# Altium footprint library Mechanical.PcbLib: 125 footprints (part 5 of 8)
Each footprint in its own frame and in the unit in brackets; x right, y up, seen from the top. Pads: shape width x height; smd on the part's side, far side on the other; paste and mask are expansions set on the pad; w line width, h text height; cw(c..) or ccw(c..) is an arc to the next point about the centre after c.
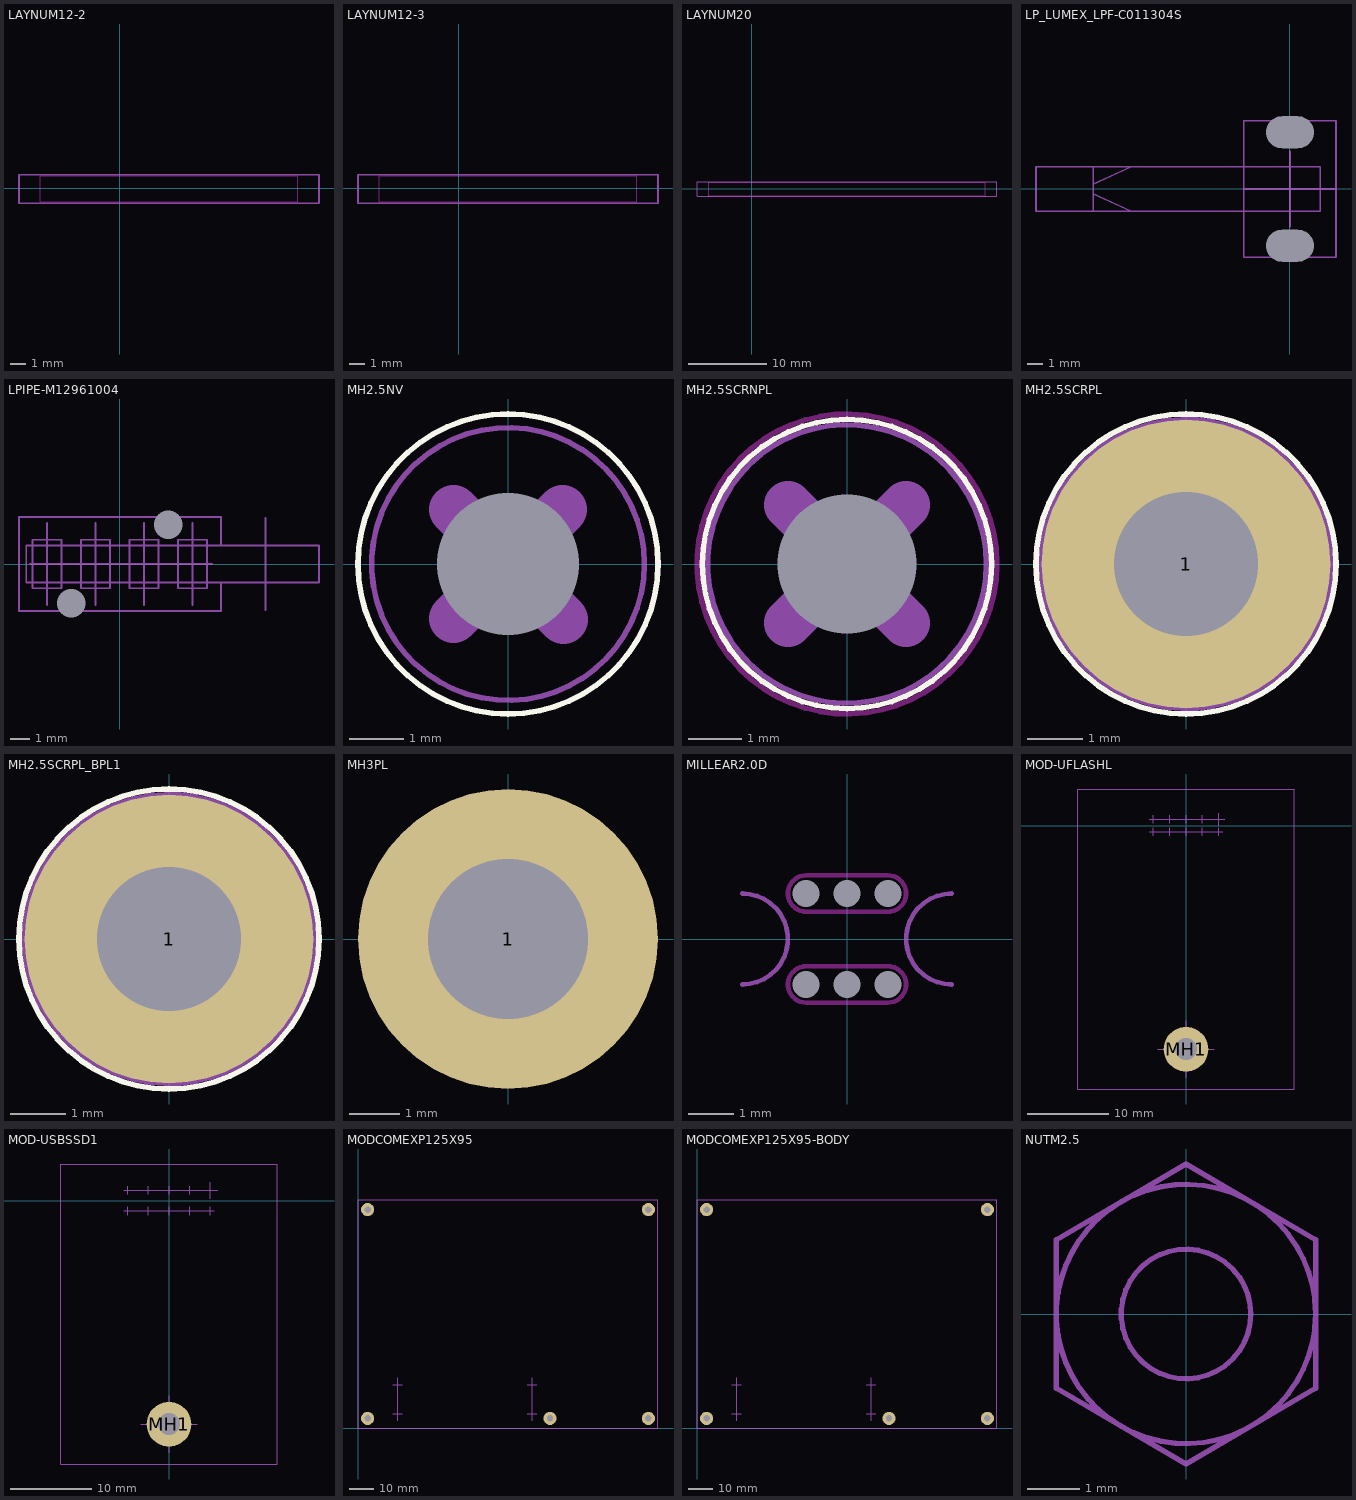
[diagram p4: the footprints below, top view; thin cyan lines are the x and y axes]

## LAYNUM12-2 [mm] "PCB 1.6mm 12 layer SGSGSPPSGSGS"
Top Layer:
  text "1" at -4.826,-0.584 h1.78
MidLayer1:
  text "3" at -2.21,-0.584 h1.78
MidLayer2:
  text "5" at 0.33,-0.584 h1.78
MidLayer3:
  text "8" at 4.166,-0.584 h1.78
MidLayer4:
  text "10" at 6.5,-0.6 h1.78
Bottom Layer:
  text "12" at 10,-0.6 h1.78
Top Solder:
  text "T" at -6.477,-0.584 h1.78
Bottom Solder:
  text "B" at 13.001,-0.584 h1.78
InternalPlane1:
  rectangle: -2.4,-0.889 11.8,0.8
  rectangle: -5.2,-0.889 -3.752,0.8
  text "2" at -3.556,-0.584 h1.78
InternalPlane2:
  region: -1.2,0.8 -5.2,0.8 -5.2,-0.9 -1.2,-0.9
  region: 11.8,0.8 0,0.8 0,-0.9 11.8,-0.9
  text "4" at -0.965,-0.584 h1.78
InternalPlane3:
  region: 11.8,0.8 2.7,0.8 2.7,-0.9 11.8,-0.9
  region: 1.4,0.8 -5.2,0.8 -5.2,-0.9 1.4,-0.9
  text "6" at 1.676,-0.584 h1.78
InternalPlane4:
  region: 11.8,0.8 3.9,0.8 3.9,-0.9 11.8,-0.9
  region: 2.6,0.8 -5.2,0.8 -5.2,-0.9 2.6,-0.9
  text "7" at 2.896,-0.584 h1.78
InternalPlane5:
  region: 5.2,0.8 -5.2,0.8 -5.2,-0.9 5.2,-0.9
  region: 11.8,0.8 6.5,0.8 6.5,-0.9 11.8,-0.9
  text "9" at 5.466,-0.584 h1.78
InternalPlane6:
  region: 11.8,0.8 9.8,0.8 9.8,-0.9 11.8,-0.9
  region: 8.2,0.8 -5.2,0.8 -5.2,-0.9 8.2,-0.9
  text "11" at 8.3,-0.6 h1.78
Keep-Out Layer:
  lines w0.025: -5.258,-0.9 11.843,-0.9 11.843,0.813 -5.258,0.813 -5.258,-0.9
Mechanical 15:
  lines w0.102: -6.68,-1 13.255,-1 13.255,0.889 -6.68,0.889 -6.68,-1

## LAYNUM12-3 [mm] "PCB 1.6mm 12 layer SGSGSssSGSGS"
Top Layer:
  text "1" at -4.826,-0.584 h1.78
MidLayer1:
  text "3" at -2.21,-0.584 h1.78
MidLayer2:
  text "5" at 0.33,-0.584 h1.78
MidLayer3:
  text "6" at 1.625,-0.6 h1.78
MidLayer4:
  text "7" at 2.875,-0.6 h1.78
MidLayer5:
  text "8" at 4.166,-0.584 h1.78
MidLayer6:
  text "10" at 6.5,-0.6 h1.78
Bottom Layer:
  text "12" at 10,-0.6 h1.78
Top Solder:
  text "T" at -6.477,-0.584 h1.78
Bottom Solder:
  text "B" at 13.001,-0.584 h1.78
InternalPlane1:
  rectangle: -5.2,-0.889 -3.752,0.8
  rectangle: -2.4,-0.889 11.8,0.8
  text "2" at -3.556,-0.584 h1.78
InternalPlane2:
  region: 11.8,0.8 0,0.8 0,-0.9 11.8,-0.9
  region: -1.2,0.8 -5.2,0.8 -5.2,-0.9 -1.2,-0.9
  text "4" at -0.965,-0.584 h1.78
InternalPlane3:
  region: 5.125,0.8 -5.2,0.8 -5.2,-0.9 5.125,-0.9
  region: 11.8,0.8 6.35,0.8 6.35,-0.9 11.8,-0.9
  text "9" at 5.35,-0.6 h1.78
InternalPlane4:
  region: 8.2,0.8 -5.2,0.8 -5.2,-0.9 8.2,-0.9
  region: 11.8,0.8 9.975,0.8 9.975,-0.9 11.8,-0.9
  text "11" at 8.375,-0.625 h1.78
Keep-Out Layer:
  lines w0.025: -5.258,-0.9 -5.258,0.813 11.843,0.813 11.843,-0.9 -5.258,-0.9
Mechanical 15:
  lines w0.102: -6.68,-1 -6.68,0.889 13.255,0.889 13.255,-1 -6.68,-1

## LAYNUM20 [mm] "PCB 3.2mm 20 layer"
Top Layer:
  text "1" at -5.2,-0.6 h1.78
MidLayer1:
  text "3" at -2.2,-0.6 h1.78
MidLayer2:
  text "5" at 0.8,-0.6 h1.78
MidLayer3:
  text "7" at 3.8,-0.6 h1.78
MidLayer4:
  text "9" at 6.8,-0.6 h1.78
MidLayer5:
  text "11" at 10.2,-0.6 h1.78
MidLayer6:
  text "13" at 14,-0.6 h1.78
MidLayer7:
  text "15" at 18,-0.6 h1.78
MidLayer8:
  text "17" at 22,-0.6 h1.78
MidLayer9:
  text "19" at 26,-0.6 h1.78
Bottom Layer:
  text "20" at 28,-0.6 h1.78
Top Solder:
  text "T" at -6.7,-0.6 h1.78
Bottom Solder:
  text "B" at 31,-0.6 h1.78
InternalPlane1:
  rectangle: -2.642,-0.914 29.87,0.813
  rectangle: -5.512,-0.914 -3.962,0.813
  text "2" at -3.7,-0.6 h1.78
InternalPlane2:
  rectangle: 0.279,-0.94 29.87,0.813
  rectangle: -5.512,-0.914 -0.889,0.813
  text "4" at -0.7,-0.6 h1.78
InternalPlane3:
  rectangle: 3.226,-0.914 29.896,0.838
  rectangle: -5.537,-0.914 2.134,0.838
  text "6" at 2.3,-0.6 h1.78
InternalPlane4:
  rectangle: 6.198,-0.914 29.87,0.813
  rectangle: -5.512,-0.914 5.156,0.813
  text "8" at 5.3,-0.6 h1.78
InternalPlane5:
  rectangle: -5.512,-0.914 8.128,0.813
  rectangle: 10.084,-0.914 29.87,0.813
  text "10" at 8.3,-0.6 h1.78
InternalPlane6:
  rectangle: -5.512,-0.914 11.913,0.813
  rectangle: 13.894,-0.914 29.87,0.813
  text "12" at 12.1,-0.6 h1.78
InternalPlane7:
  rectangle: -5.512,-0.914 15.824,0.813
  rectangle: 17.805,-0.94 29.87,0.813
  text "14" at 16,-0.6 h1.78
InternalPlane8:
  rectangle: -2.642,-0.914 19.812,0.813
  rectangle: 21.768,-0.914 29.87,0.813
  text "16" at 20,-0.6 h1.78
InternalPlane9:
  rectangle: -5.512,-0.914 23.825,0.813
  rectangle: 25.781,-0.914 29.87,0.813
  text "18" at 24,-0.6 h1.78
Keep-Out Layer:
  lines w0.025: -5.512,-0.914 -5.512,0.813 29.87,0.813 29.87,-0.914 -5.512,-0.914
Mechanical 15:
  lines w0.102: -7,-1 31.394,-1 31.394,0.889 -7,0.889 -7,-1

## LP_LUMEX_LPF-C011304S [mm]
height 7
pads (2):
  oval 1x0 hole 2 slot 3 at 0 deg unplated mask+1.2: MH1(0,-3.575) MH1(0,3.575)
Mechanical 13:
  lines w0.1: -12.4,-1.4 -12.4,1.4 ; -12.4,-0.3 -10,-1.4 ; -12.4,0.3 -10,1.4 ; -16,-1.4 1.9,-1.4 1.9,1.4 -16,1.4 -16,-1.4 ; -2.9,-4.3 -2.9,4.3 2.9,4.3 2.9,-4.3 -2.9,-4.3
Mechanical 15:
  lines w0.1: -2.9,0 2.9,0 ; 0,-2.375 0,2.375
3D body: height 6.5, standoff -2.73, extent -16,-4.8 2.9,4.8

## LPIPE-M12961004 [mm] "Light pipe 4x vertical"
height 11.1
pads (2):
  round 0 hole 1.5 unplated mask+0.85: mh1(-2.54,-2.05) mh2(2.54,2.05)
Mechanical 13:
  lines w0.1: 5.3,-0.975 5.3,-2.45 -5.28,-2.45 -5.28,2.45 5.3,2.45 5.3,0.975 ; -4.9,-0.975 10.425,-0.975 10.425,0.975 -4.9,0.975 -4.9,-0.975
Mechanical 15:
  lines w0.1: -4.699,0 4.826,0 ; -3.81,-2.159 -3.81,2.159 ; -1.27,-2.159 -1.27,2.159 ; 1.27,-2.159 1.27,2.159 ; 3.81,-2.159 3.81,2.159 ; 7.62,-2.413 7.62,2.413 ; -4.572,-1.27 -4.572,1.27 -3.048,1.27 -3.048,-1.27 -4.572,-1.27 ; -2.032,-1.27 -0.508,-1.27 -0.508,1.27 -2.032,1.27 -2.032,-1.27 ; 0.508,-1.27 2.032,-1.27 2.032,1.27 0.508,1.27 0.508,-1.27 ; 3.048,-1.27 4.572,-1.27 4.572,1.27 3.048,1.27 3.048,-1.27
  text "front int." at 7.366,-2.159 h0.5
3D body: height 11.13, standoff -3.1, extent -5.3,-2.45 10.42,2.45

## MH2.5NV [mm] "Montazna luknja 2.5mm none/vijak spodaj"
height 2
pads (1):
  round 0 hole 2.6 unplated paste-2 mask+1.5: 1(0,0)
Top Overlay:
  circle w0.102: c0,0 r2.75
Mechanical 13:
  circle w0.102: c0,0 r2.5
  lines w0.9: -1,-1 0,0 1,1 ; -1,1 1.019,-1.019
Mechanical 15:
  lines w0.102: -1.25,0 1.25,0 ; 0,-1.25 0,1.25
3D body: height 2.2, standoff 0, extent -2.5,-2.5 2.5,2.5

## MH2.5SCRNPL [mm] "Mounting Hole 2.6mm; Screw 2.5mm DIN7985A non plated hole"
height 2
pads (1):
  round 0 hole 2.6 unplated paste-2 mask+2.5: 1(0,0)
Top Layer keep-out:
  circle w0.102: c0,0 r2.8
Top Overlay:
  circle w0.102: c0,0 r2.7
Mechanical 13:
  circle w0.102: c0,0 r2.6
  lines w0.9: -1.1,-1.1 0,0 1.1,1.1 ; -1.1,1.1 1.1,-1.1
Mechanical 15:
  lines w0.102: -1.25,0 1.25,0 ; 0,-1.25 0,1.25
3D body: height 0.81, standoff 0.8, extent -2.2,-2.3 2.3,2.3
3D body: height 2, standoff 0.8, extent -2.591,-2.591 2.6,2.616
3D body: height 0.8, standoff 0, extent -2.591,-2.591 2.6,2.616

## MH2.5SCRPL [mm] "Mounting Hole 2.6mm; Screw 2.5mm DIN7985A plated hole"
height 2
pads (1):
  round 5.2 / inner round 3.7 / far side round 3.7 hole 2.6 paste-2: 1(0,0)
Top Overlay:
  circle w0.102: c0,0 r2.7
Mechanical 13:
  circle w0.102: c0,0 r2.6
  lines w0.9: -1.1,-1.1 0,0 1.1,1.1 ; -1.1,1.1 1.1,-1.1
Mechanical 15:
  lines w0.102: -1.25,0 1.25,0 ; 0,-1.25 0,1.25
3D body: height 2, standoff -4.98, extent -2.5,-2.495 2.48,2.495

## MH2.5SCRPL_BPL1 [mm] "Mounting Hole 2.6mm; Screw 2.5mm DIN7985A plated hole"
height 2.4
pads (1):
  round 5.2 / inner round 3.7 / far side rect 8.2x7.2 hole 2.6 paste-2: 1(0,0)
Top Overlay:
  circle w0.102: c0,0 r2.7
Mechanical 13:
  circle w0.102: c0,0 r2.6
  lines w0.9: -1.1,-1.1 0,0 1.1,1.1 ; -1.1,1.1 1.1,-1.1
Mechanical 15:
  lines w0.102: -1.25,0 1.25,0 ; 0,-1.25 0,1.25
3D body: height 0.8, standoff 0, extent -2.591,-2.591 2.6,2.616
3D body: height 2, standoff 0.8, extent -2.591,-2.591 2.6,2.616
3D body: height 0.81, standoff 0.8, extent -2.2,-2.3 2.3,2.3

## MH3PL [mm] "Montazna luknja 3mm vijak/dist"
height 2
pads (1):
  round 6 hole 3.2 paste-2 mask+0.5: 1(0,0)
Top Overlay:
  circle w0.102: c0,0 r2.75
Mechanical 15:
  lines w0.102: -1.25,0 1.25,0 ; 0,-1.25 0,1.25

## MILLEAR2.0D [mm] "Milling ear for PCB cut dual side holes"
pads (6):
  round 0 hole 0.6 unplated: 0(0,-1) 0(0,1) 1(-0.9,-1) 1(0.9,1) 2(-0.9,1) 2(0.9,-1)
Keep-Out Layer:
  lines w0.102: -0.9,-1.4 cw(c-0.9,-1) -0.9,-0.6 0.9,-0.6 cw(c0.9,-1) 0.9,-1.4 -0.9,-1.4 ; -0.9,0.6 cw(c-0.9,1) -0.9,1.4 0.9,1.4 cw(c0.9,1) 0.9,0.6 -0.9,0.6
Mechanical 1:
  lines w0.102: -2.3,-1 ccw(c-2.3,0) -2.3,1 ; 2.3,-1 cw(c2.3,0) 2.3,1
Mechanical 15:
  lines w0.102: -2.3,-1 ccw(c-2.3,0) -2.3,1 ; 2.3,-1 cw(c2.3,0) 2.3,1

## MOD-UFLASHL [mm] "USB flash  SSD low profile R2mm 36.9x26.6mm"
height 7.5
pads (1):
  round 5.5 hole 2.7 mask+0.2: MH1(0,-27.5)
Mechanical 13:
  lines w0.127: -13.3,-32.4 -13.3,4.5 13.3,4.5 13.3,-32.4 -13.3,-32.4
Mechanical 15:
  circle w0.102: c0,-27.5 r1.6
  lines w0.102: -4.5,-0.77 4.5,-0.77 ; -4.5,0.77 4.75,0.77 ; -4,-1.27 -4,-0.27 ; -4,0.27 -4,1.27 ; -3.5,-27.5 3.5,-27.5 ; -2,-1.27 -2,-0.27 ; -2,0.27 -2,1.27 ; 0,-31 0,-24 ; 0,-1.25 0,-0.25 ; 0,0.27 0,1.27 ; 2,-1.25 2,-0.25 ; 2,0.27 2,1.27 ; 4,-1.27 4,-0.27 ; 4,0 4,1.5 ; -13.3,-32.4 13.3,-32.4 13.3,4.5 -13.3,4.5 -13.3,-32.4
  text "USB FLAS DISK" at -11.75,-20.25 h1
  text "1" at 4.5,1.25 h1
3D body: height 6.6, standoff 5, extent -13.3,-32.4 13.3,4.5

## MOD-USBSSD1 [mm] "USB flash  SSD low profile R2.54mm 36.9x26.6mm"
height 9.6
pads (1):
  round 5.5 hole 2.7 mask+0.2: MH1(0,-27.5)
Mechanical 13:
  lines w0.127: -13.3,-32.4 -13.3,4.5 13.3,4.5 13.3,-32.4 -13.3,-32.4
Mechanical 15:
  circle w0.102: c0,-27.5 r1.6
  lines w0.102: -5.588,-1.27 5.588,-1.27 ; -5.588,1.27 5.969,1.27 ; -5.08,-1.778 -5.08,-0.762 ; -5.08,0.762 -5.08,1.778 ; -3.5,-27.5 3.5,-27.5 ; -2.54,-1.778 -2.54,-0.762 ; -2.54,0.762 -2.54,1.778 ; 0,-31 0,-24 ; 0,-1.778 0,-0.762 ; 0,0.762 0,1.778 ; 2.54,-1.778 2.54,-0.762 ; 2.54,0.762 2.54,1.778 ; 5.08,-1.778 5.08,-0.762 ; 5.08,0.254 5.08,2.286 ; -13.3,-32.4 13.3,-32.4 13.3,4.5 -13.3,4.5 -13.3,-32.4
  text "USB FLAS DISK" at -11.75,-20.25 h1
  text "1" at 5.588,1.778 h1
3D body: height 6.6, standoff 5, extent -13.3,-32.4 13.3,4.5

## MODCOMEXP125X95 [mm] "Com Express module 125x95mm"
height 24
pads (5):
  round 5.5 hole 2.7 mask+0.2: MH1(4,4) MH2(121,4) MH3(121,91) MH4(4,91) MH5(80,4)
Mechanical 15:
  lines w0.25: 14.5,6 18.5,6 ; 14.5,18 18.5,18 ; 16.5,3 16.5,21 ; 70.5,6 74.5,6 ; 70.5,18 74.5,18 ; 72.5,3 72.5,21 ; 0,0 0,95 125,95 125,0 0,0

## MODCOMEXP125X95-BODY [mm] "Com Express module 125x95mm with mech. body"
height 24
pads (5):
  round 5.5 hole 2.7 mask+0.2: MH1(4,4) MH2(121,4) MH3(121,91) MH4(4,91) MH5(80,4)
Mechanical 13:
  lines w0.127: 0,0 125,0 125,95 0,95 0,0
Mechanical 15:
  lines w0.25: 14.5,6 18.5,6 ; 14.5,18 18.5,18 ; 16.5,3 16.5,21 ; 70.5,6 74.5,6 ; 70.5,18 74.5,18 ; 72.5,3 72.5,21 ; 0,0 125,0 125,95 0,95 0,0
3D body: height 19, standoff 9.6, extent 1.5,88.5 6.5,93.5
3D body: height 19, standoff 9.6, extent 1.5,1.5 6.5,6.5
3D body: height 19, standoff 9.6, extent 77.5,1.5 82.5,6.5
3D body: height 19, standoff 9.6, extent 118.5,1.5 123.5,6.5
3D body: height 19, standoff 9.6, extent 118.5,88.5 123.5,93.5
3D body: height 21, standoff 19, extent 0,0 125,95
3D body: height 9.6, standoff 8, extent 0,0 125,95

## NUTM2.5 [mm] "Nut M2.5 NO HOLE"
height 2
Mechanical 13:
  circle w0.102: c0,0 r1.25
  circle w0.102: c0,0 r2.5
  lines w0.102: -2.5,-1.432 0,-2.893 2.5,-1.432 2.5,1.432 0,2.893 -2.5,1.432 -2.5,-1.432
3D body: height 2, standoff 0, extent -2.5,-2.893 2.5,2.893